# Altium footprint library vmorais_libraries.PcbLib: 94 footprints (part 6 of 6)
Each footprint in its own frame and in the unit in brackets; x right, y up, seen from the top. Pads: shape width x height; smd on the part's side, far side on the other; paste and mask are expansions set on the pad; w line width, h text height; cw(c..) or ccw(c..) is an arc to the next point about the centre after c.
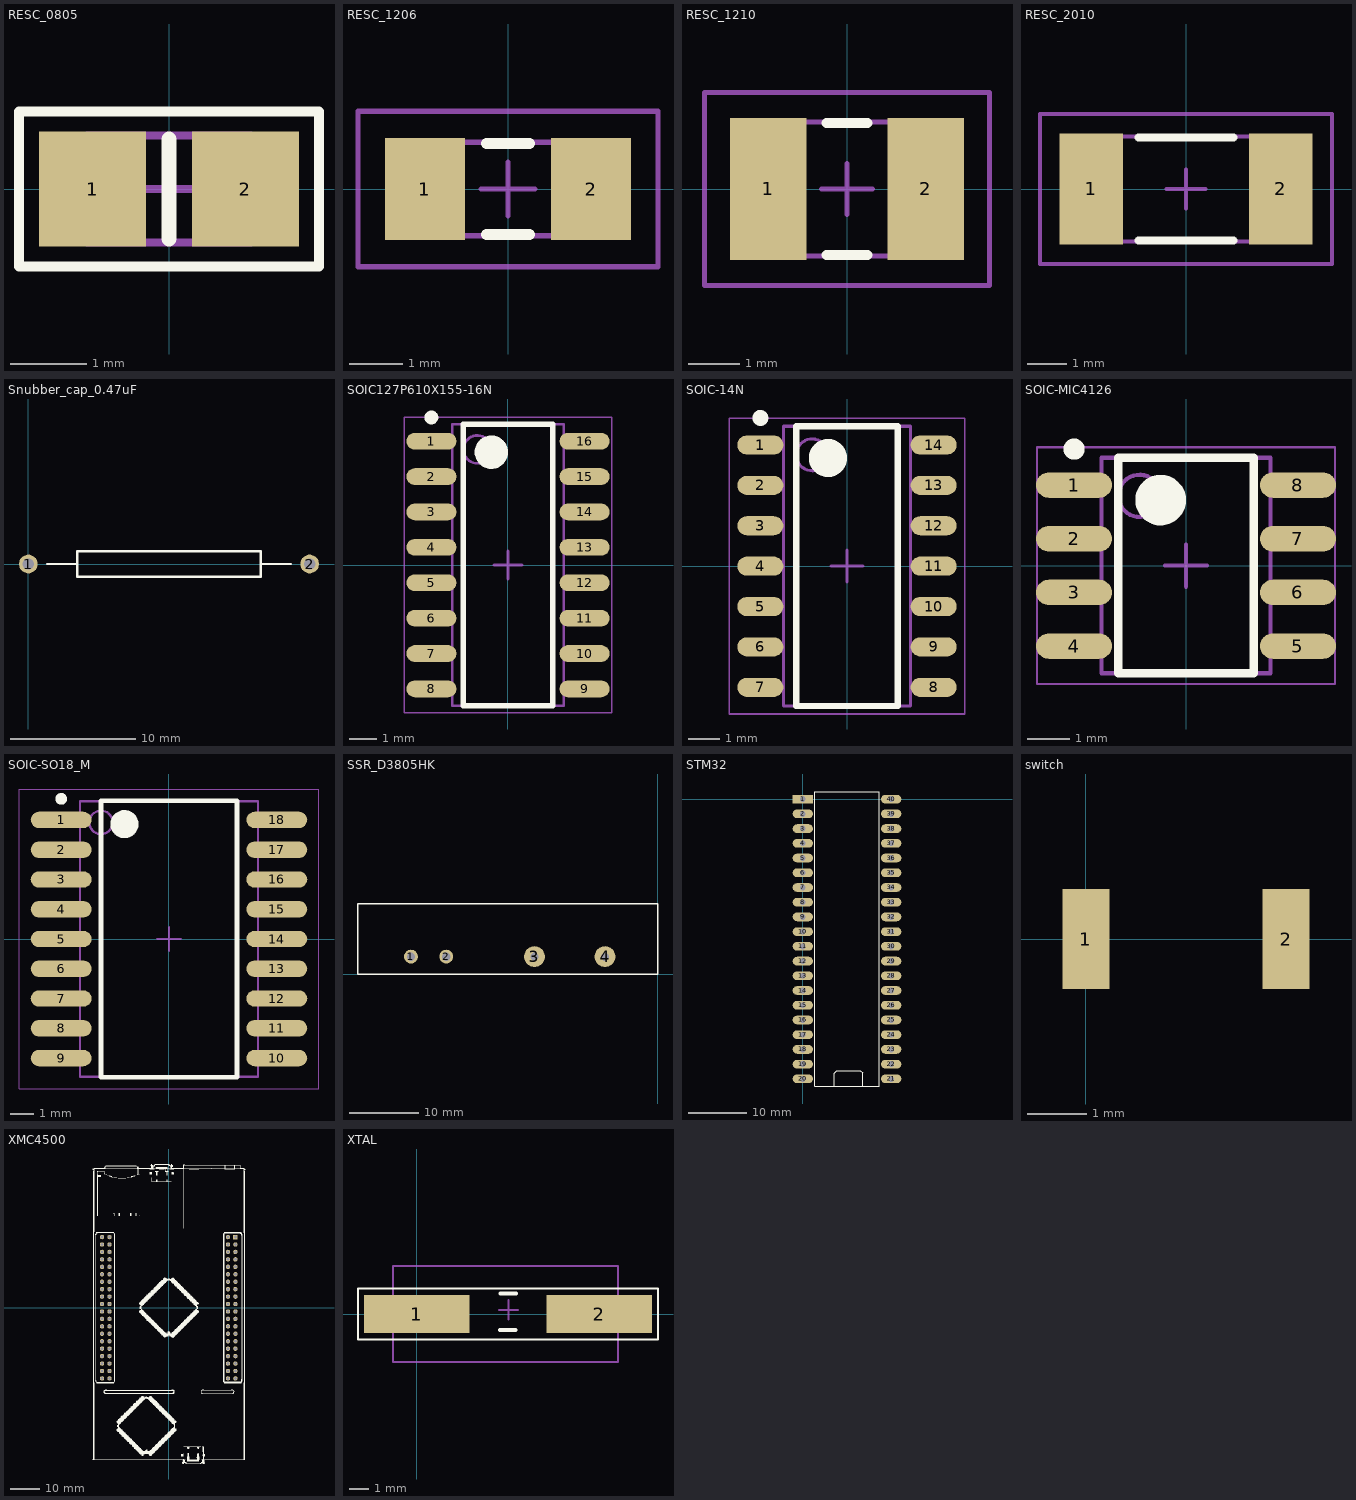
[diagram p5: the footprints below, top view; thin cyan lines are the x and y axes]

## RESC_0805 [mm] "Chip Resistor, Body 2.0x1.3mm, IPC Low Density"
height 0.65
pads (2):
  rect 1.4x1.5 smd: 1(-1,0) 2(1,0)
Top Overlay:
  lines w0.127: -1.965,-1.015 -1.965,1.015 1.965,1.015 1.965,-1.015 -1.965,-1.015
  lines w0.2: 0,-0.65 0,0.65
Mechanical 13:
  lines w0.1: -1.075,-0.7 1.075,-0.7 1.075,0.7 -1.075,0.7 -1.075,-0.7
Mechanical 15:
  lines w0.1: -0.5,0 0.5,0 ; 0,-0.5 0,0.5
3D body: height 0.65, standoff 0, extent -1.075,-0.7 1.075,0.7

## RESC_1206 [mm] "Chip Resistor, Body 3.2x1.6mm, IPC Low Density"
height 0.71
pads (2):
  rect 1.5x1.9 smd: 1(-1.55,0) 2(1.55,0)
Top Overlay:
  lines w0.2: -0.4,-0.85 0.4,-0.85 ; -0.4,0.85 0.4,0.85
Mechanical 13:
  lines w0.1: -1.675,-0.875 -1.675,0.875 1.675,0.875 1.675,-0.875 -1.675,-0.875
Mechanical 15:
  lines w0.1: -0.5,0 0.5,0 ; 0,-0.5 0,0.5 ; -2.8,-1.45 -2.8,1.45 2.8,1.45 2.8,-1.45 -2.8,-1.45
3D body: height 0.71, standoff 0, extent -1.675,-0.875 1.675,0.875

## RESC_1210 [mm] "Chip Resistor, Body 3.2x2.5mm, IPC Low Density"
height 0.71
pads (2):
  rect 1.5x2.8 smd: 1(-1.55,0) 2(1.55,0)
Top Overlay:
  lines w0.2: -0.4,-1.3 0.4,-1.3 ; -0.4,1.3 0.4,1.3
Mechanical 13:
  lines w0.1: -1.675,-1.32 1.675,-1.32 1.675,1.32 -1.675,1.32 -1.675,-1.32
Mechanical 15:
  lines w0.1: -0.5,0 0.5,0 ; 0,-0.5 0,0.5 ; -2.8,-1.9 2.8,-1.9 2.8,1.9 -2.8,1.9 -2.8,-1.9
3D body: height 0.71, standoff 0, extent -1.675,-1.32 1.675,1.32

## RESC_2010 [mm] "Chip Resistor, Body 5.0x2.5mm, IPC Low Density"
height 0.71
pads (2):
  rect 1.6x2.8 smd: 1(-2.4,0) 2(2.4,0)
Top Overlay:
  lines w0.2: -1.2,-1.3 1.2,-1.3 ; -1.2,1.3 1.2,1.3
Mechanical 13:
  lines w0.1: -2.575,-1.325 2.575,-1.325 2.575,1.325 -2.575,1.325 -2.575,-1.325
Mechanical 15:
  lines w0.1: -0.5,0 0.5,0 ; 0,-0.5 0,0.5 ; -3.7,-1.9 3.7,-1.9 3.7,1.9 -3.7,1.9 -3.7,-1.9
3D body: height 0.71, standoff 0, extent -2.575,-1.325 2.575,1.325

## Snubber_cap_0.47uF [mm]
pads (2):
  round 1.5 hole 0.9: 1(0,0) 2(22.5,0)
Top Overlay:
  lines w0.2: 1.5,0 3.925,0 ; 18.575,0 21,0 ; 3.925,0 3.925,-1 18.575,-1 18.575,1 3.925,1 3.925,0
3D body: height 3, standoff 1, extent -1.168,-9.449 23.673,-1.549

## SOIC127P610X155-16N [mm] "SOIC, 16-Leads, Body 10,05x3,95mm, Pitch 1,27mm, IPC Medium Density"
height 1.55
pads (16):
  oval 1.8x0.6 smd: 1(-2.75,4.445) 2(-2.75,3.175) 3(-2.75,1.905) 4(-2.75,0.635) 5(-2.75,-0.635) 6(-2.75,-1.905) 7(-2.75,-3.175) 8(-2.75,-4.445) 9(2.75,-4.445) 10(2.75,-3.175) 11(2.75,-1.905) 12(2.75,-0.635) 13(2.75,0.635) 14(2.75,1.905) 15(2.75,3.175) 16(2.75,4.445)
Top Overlay:
  circle w0.25: c-2.75,5.295 r0.125
  circle w0.6: c-0.6,4.05 r0.3
  lines w0.2: -1.6,-5.05 -1.6,5.05 1.6,5.05 1.6,-5.05 -1.6,-5.05
Mechanical 13:
  circle w0.1: c-1.1,4.15 r0.5
  lines w0.1: -2,-5.05 -2,5.05 2,5.05 2,-5.05 -2,-5.05
Mechanical 15:
  lines w0.05: -3.725,-5.3 -3.725,5.3 3.725,5.3 3.725,-5.3 -3.725,-5.3
  lines w0.1: -0.5,0 0.5,0 ; 0,-0.5 0,0.5
3D body "SOIC127P610X155-16N.step": height 1.55, standoff 0, extent -3.075,-5.05 3.075,5.05

## SOIC-14N [mm] "SOIC, 14-Leads, Body 8,65x3,90mm, Pitch 1,27mm, IPC Medium Density"
height 1.75
pads (14):
  oval 1.45x0.6 smd: 1(-2.725,3.81) 2(-2.725,2.54) 3(-2.725,1.27) 4(-2.725,0) 5(-2.725,-1.27) 6(-2.725,-2.54) 7(-2.725,-3.81) 8(2.725,-3.81) 9(2.725,-2.54) 10(2.725,-1.27) 11(2.725,0) 12(2.725,1.27) 13(2.725,2.54) 14(2.725,3.81)
Top Overlay:
  circle w0.25: c-2.725,4.66 r0.125
  circle w0.6: c-0.6,3.4 r0.3
  lines w0.2: -1.6,-4.4 -1.6,4.4 1.6,4.4 1.6,-4.4 -1.6,-4.4
Mechanical 13:
  circle w0.1: c-1.1,3.5 r0.5
  lines w0.1: -2,-4.4 -2,4.4 2,4.4 2,-4.4 -2,-4.4
Mechanical 15:
  lines w0.05: -3.7,-4.65 -3.7,4.65 3.7,4.65 3.7,-4.65 -3.7,-4.65
  lines w0.1: -0.5,0 0.5,0 ; 0,-0.5 0,0.5
3D body: height 1.75, standoff 0.25, extent -2,-4.4 2,4.4

## SOIC-MIC4126 [mm] "SOIC, 8-Leads, Body 5,08x3,95mm, Pitch 1,27mm, IPC Medium Density"
height 1.55
pads (8):
  oval 1.8x0.6 smd: 1(-2.65,1.905) 2(-2.65,0.635) 3(-2.65,-0.635) 4(-2.65,-1.905) 5(2.65,-1.905) 6(2.65,-0.635) 7(2.65,0.635) 8(2.65,1.905)
Top Overlay:
  circle w0.25: c-2.65,2.755 r0.125
  circle w0.6: c-0.6,1.55 r0.3
  lines w0.2: -1.6,-2.55 -1.6,2.55 1.6,2.55 1.6,-2.55 -1.6,-2.55
Mechanical 13:
  circle w0.1: c-1.1,1.65 r0.5
  lines w0.1: -2,-2.55 -2,2.55 2,2.55 2,-2.55 -2,-2.55
Mechanical 15:
  lines w0.05: -3.525,-2.8 -3.525,2.8 3.525,2.8 3.525,-2.8 -3.525,-2.8
  lines w0.1: -0.5,0 0.5,0 ; 0,-0.5 0,0.5
3D body "SOIC127P560X155-8N.step": height 1.55, standoff 0, extent -2.825,-2.55 2.825,2.55

## SOIC-SO18_M [mm] "SOIC, 18-Leads, Body 11.5x7.5mm, Pitch 1.27mm, IPC Low Density"
height 2.65
pads (18):
  oval 2.6x0.7 smd: 1(-4.6,5.08) 2(-4.6,3.81) 3(-4.6,2.54) 4(-4.6,1.27) 5(-4.6,0) 6(-4.6,-1.27) 7(-4.6,-2.54) 8(-4.6,-3.81) 9(-4.6,-5.08) 10(4.6,-5.08) 11(4.6,-3.81) 12(4.6,-2.54) 13(4.6,-1.27) 14(4.6,0) 15(4.6,1.27) 16(4.6,2.54) 17(4.6,3.81) 18(4.6,5.08)
Top Overlay:
  circle w0.25: c-4.6,5.98 r0.125
  circle w0.6: c-1.9,4.9 r0.3
  lines w0.2: -2.9,-5.9 -2.9,5.9 2.9,5.9 2.9,-5.9 -2.9,-5.9
Mechanical 13:
  circle w0.1: c-2.9,4.975 r0.5
  lines w0.1: -3.8,-5.875 -3.8,5.875 3.8,5.875 3.8,-5.875 -3.8,-5.875
Mechanical 15:
  lines w0.05: -6.4,-6.4 -6.4,6.4 6.4,6.4 6.4,-6.4 -6.4,-6.4
  lines w0.1: -0.5,0 0.5,0 ; 0,-0.5 0,0.5
3D body: height 2.65, standoff 0.1, extent -3.8,-5.875 3.8,5.875

## SSR_D3805HK [mm]
pads (4):
  round 2 hole 1.2: 1(-35.56,2.515)
  round 2 hole 1.2 paste+0: 2(-30.48,2.515)
  round 3 hole 1.2: 3(-17.78,2.515) 4(-7.62,2.515)
Top Overlay:
  lines w0.2: 0,-0.025 -43.18,-0.025 -43.18,10.135 0,10.135 ; 0,0 0,10.109
3D body: height 25.4, standoff 0.51, extent -43.078,0.076 -0.102,10.033

## STM32 [mm]
pads (40):
  rect 3.5x1.5 hole 1: 1(0,0)
  oval 3.5x1.5 hole 1: 2(0,-2.54) 3(0,-5.08) 4(0,-7.62) 5(0,-10.16) 6(0,-12.7) 7(0,-15.24) 8(0,-17.78) 9(0,-20.32) 10(0,-22.86) 11(0,-25.4) 12(0,-27.94) 13(0,-30.48) 14(0,-33.02) 15(0,-35.56) 16(0,-38.1) 17(0,-40.64) 18(0,-43.18) 19(0,-45.72) 20(0,-48.26) 21(15.24,-48.26) 22(15.24,-45.72) 23(15.24,-43.18) 24(15.24,-40.64) 25(15.24,-38.1) 26(15.24,-35.56) 27(15.24,-33.02) 28(15.24,-30.48) 29(15.24,-27.94) 30(15.24,-25.4) 31(15.24,-22.86) 32(15.24,-20.32) 33(15.24,-17.78) 34(15.24,-15.24) 35(15.24,-12.7) 36(15.24,-10.16) 37(15.24,-7.62) 38(15.24,-5.08) 39(15.24,-2.54) 40(15.24,0)
Top Overlay:
  lines w0.2: 5.461,-49.454 5.461,-47.269 5.893,-46.838 9.931,-46.838 10.312,-47.219 10.312,-49.479 ; 13.132,1.27 2.085,1.27 2.085,-49.53 13.155,-49.53 13.155,1.27
3D body "STM32F103C8T6-BOARD.STP": height 13.1, standoff -3.9, extent -3.702,-51.943 19.298,5.857

## switch [mm] "Chip Resistor, Body 2.0x1.3mm, IPC Low Density"
height 0.65
pads (2):
  rect 0.8x1.7 smd: 1(0,0) 2(3.4,0)
3D body: height 1.2, standoff 0, extent 0.229,-1.295 3.226,1.219

## XMC4500 [mm]
pads (80):
  rect 1.5x1.5 hole 0.9: 1(22.77,24.13)
  round 1.5 hole 0.9: 2(22.77,21.59) 3(22.77,19.05) 4(22.77,16.51) 5(22.77,13.97) 6(22.77,11.43) 7(22.77,8.89) 8(22.77,6.35) 9(22.77,3.81) 10(22.77,1.27) 11(22.77,-1.27) 12(22.77,-3.81) 13(22.77,-6.35) 14(22.77,-8.89) 15(22.77,-11.43) 16(22.77,-13.97) 17(22.77,-16.51) 18(22.77,-19.05) 19(22.77,-21.59) 20(22.77,-24.13) 21(20.23,-24.13) 22(20.23,-21.59) 23(20.23,-19.05) 24(20.23,-16.51) 25(20.23,-13.97) 26(20.23,-11.43) 27(20.23,-8.89) 28(20.23,-6.35) 29(20.23,-3.81) 30(20.23,-1.27) 31(20.23,1.27) 32(20.23,3.81) 33(20.23,6.35) 34(20.23,8.89) 35(20.23,11.43) 36(20.23,13.97) 37(20.23,16.51) 38(20.23,19.05) 39(20.23,21.59) 40(20.23,24.13) 41(-20.23,24.13) 42(-20.23,21.59) 43(-20.23,19.05) 44(-20.23,16.51) 45(-20.23,13.97) 46(-20.23,11.43) 47(-20.23,8.89) 48(-20.23,6.35) 49(-20.23,3.81) 50(-20.23,1.27) 51(-20.23,-1.27) 52(-20.23,-3.81) 53(-20.23,-6.35) 54(-20.23,-8.89) 55(-20.23,-11.43) 56(-20.23,-13.97) 57(-20.23,-16.51) 58(-20.23,-19.05) 59(-20.23,-21.59) 60(-20.23,-24.13) 61(-22.77,-24.13) 62(-22.77,-21.59) 63(-22.77,-19.05) 64(-22.77,-16.51) 65(-22.77,-13.97) 66(-22.77,-11.43) 67(-22.77,-8.89) 68(-22.77,-6.35) 69(-22.77,-3.81) 70(-22.77,-1.27) 71(-22.77,1.27) 72(-22.77,3.81) 73(-22.77,6.35) 74(-22.77,8.89) 75(-22.77,11.43) 76(-22.77,13.97) 77(-22.77,16.51) 78(-22.77,19.05) 79(-22.77,21.59) 80(-22.77,24.13)
Top Overlay:
  drawing of 7 lines, arcs and shapes, not listed
3D body "SIL_Socket36.stp": height 8.5, standoff -14.85, extent 18.96,-20.32 24.04,25.4
3D body "SIL_Socket36.stp": height 8.5, standoff -14.85, extent 18.96,-25.4 24.04,20.32
3D body "SIL_Socket36.stp": height 8.5, standoff -14.85, extent -24.04,-25.4 -18.96,20.32
3D body "SIL_Socket36.stp": height 8.5, standoff -14.85, extent -24.04,-20.32 -18.96,25.4

## XTAL [mm] "XTAL"
height 1.35
pads (2):
  rect 5.5x2 smd: 1(0,0) 2(9.5,0)
Top Overlay:
  lines w0.127: -3.05,-1.325 12.55,-1.325 12.55,1.325 -3.05,1.325 -3.05,-1.325
  lines w0.2: 4.342,-0.834 5.142,-0.834 ; 4.367,1.069 5.167,1.069
Mechanical 13:
  lines w0.1: -1.225,-2.501 -1.225,2.499 10.475,2.499 10.475,-2.501 -1.225,-2.501
Mechanical 15:
  lines w0.1: 4.267,0.219 5.267,0.219 ; 4.767,-0.281 4.767,0.719
3D body: height 1.35, standoff 0, extent -1.175,-2.449 10.4,2.451